# Altium integrated library Regulators.IntLib: 149 symbols (continued)
## MCP1640T-I/CHY (continued)
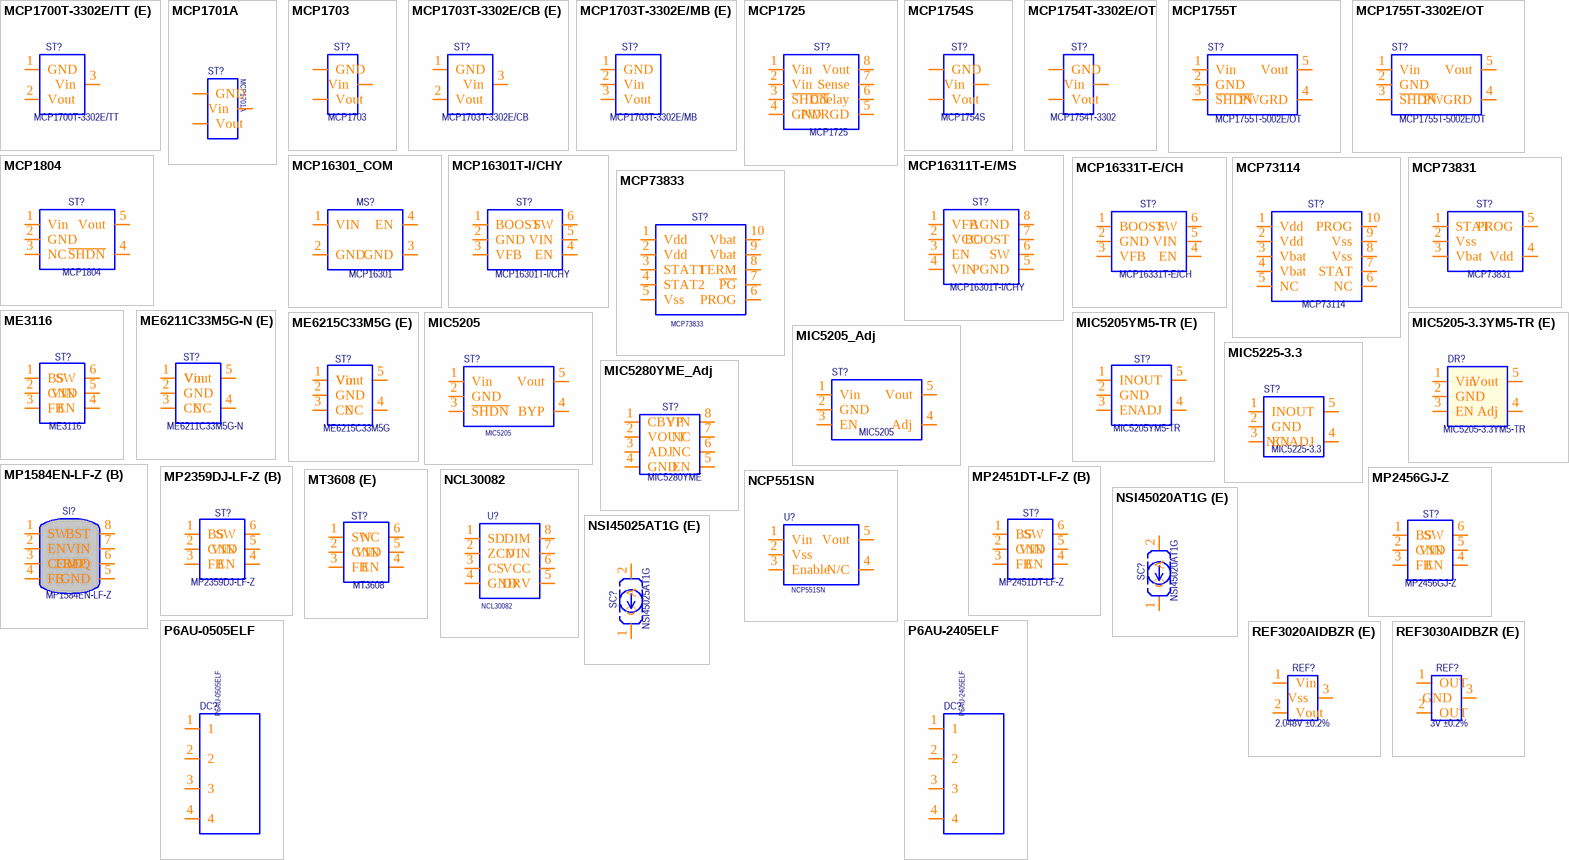
[diagram p2: symbols MCP1700T-3302E/TT (E) to REF3030AIDBZR (E)]

## MCP1700T-3302E/TT (E)
designator ST?, comment MCP1700T-3302E/TT
LOW DROPOUT REGULATORS(LDO) POSITIVE FIXED 350MV @ 250MA 6V 3.3V 250MA SOT-23(SOT-23-3) ROHS; Manufacturer: Microchip Tech; Marking: CSY9; Detailed Description: LOW DROPOUT REGULATORS(LDO) POSITIVE FIXED 680MV @ 100MA 6V 3.3V 200MA SOT-23-3L ROHS; ComponentLink1URL: http://www.microchip.com/wwwproducts/en/en554058; ComponentLink2URL: http://ww1.microchip.com/downloads/en/DeviceDoc/20005004D.pdf; Package / Case: SOT-23-3; PartNumber LCSC: C39051; Note: LOW DROPOUT REGULATORS(LDO); Operating Temperature: -40C to +85C; Voltage: 6V 3.3V 250MA; HelpURL: https://datasheet.lcsc.com/szlcsc/Microchip-Tech-MCP1700T-3302E-TT_C39051.pdf; Manufacturer PartNumber: MCP1700T-3302E/TT; Pricing LCSC: 0.2504; Publisher: Catcatcat Electronics; Website developer: http://catcatcat.d-lan.dp.ua/; Assembly type: Extended Part; Value: MCP1700T-3302E/TT
footprint SOT-23-3
pins: 1 GND, 2 Vout, 3 Vin

## MCP1701A
designator ST?  (value not drawn)
Value: *; Publisher: Catcatcat Electronics; Operating Temperature: -40C to +85C; Website developer: http://catcatcat.d-lan.dp.ua/; Assembly type: Basic Extended Part
footprint SOT-23-3N
pins: 1 GND, 2 Vout, 3 Vin

## MCP1703
designator ST?  value MCP1703  (hidden comment: *)
Publisher: Catcatcat Electronics; Operating Temperature: -40C to +85C; Website developer: http://catcatcat.d-lan.dp.ua/; Assembly type: Basic Extended Part
footprint SOT-23-3L
pins: 1 GND, 2 Vout, 3 Vin

## MCP1703T-3302E/CB (E)
designator ST?, comment MCP1703T-3302E/CB
LOW DROPOUT REGULATORS(LDO) POSITIVE FIXED 725MV @ 250MA 16V 3.3V 250MA SOT-23-3L ROHS; Manufacturer: Microchip Tech; Marking: HUES; Detailed Description: LOW DROPOUT REGULATORS(LDO) POSITIVE FIXED 680MV @ 100MA 6V 3.3V 200MA SOT-23-3L ROHS; ComponentLink1URL: http://www.microchip.com/wwwproducts/en/en554058; ComponentLink2URL: http://ww1.microchip.com/downloads/en/DeviceDoc/20005004D.pdf; Package / Case: SOT-23-3L; PartNumber LCSC: C53352; Note: LOW DROPOUT REGULATORS(LDO); Operating Temperature: -40C to +85C; Voltage: 16V 3.3V 250MA; HelpURL: https://datasheet.lcsc.com/szlcsc/Microchip-Tech-MCP1703T-3302E-CB_C53352.pdf; Manufacturer PartNumber: MCP1703T-3302E/CB; Pricing LCSC: 0.3838; Publisher: Catcatcat Electronics; Website developer: http://catcatcat.d-lan.dp.ua/; Assembly type: Extended Part; Value: MCP1703T-3302E/CB
footprint SOT-23-3L
pins: 1 GND, 2 Vout, 3 Vin

## MCP1703T-3302E/MB (E)
designator ST?, comment MCP1703T-3302E/MB
LOW DROPOUT REGULATORS(LDO) POSITIVE FIXED 725MV @ 250MA 16V 3.3V 250MA SOT-89(SOT-89-3) ROHS; Manufacturer: Microchip Tech; Marking: HU1824; Detailed Description: LOW DROPOUT REGULATORS(LDO) POSITIVE FIXED 680MV @ 100MA 6V 3.3V 200MA SOT-23-3L ROHS; ComponentLink1URL: http://www.microchip.com/wwwproducts/en/en554058; ComponentLink2URL: http://ww1.microchip.com/downloads/en/DeviceDoc/20005004D.pdf; Package / Case: SOT-89-3; PartNumber LCSC: C27287; Note: LOW DROPOUT REGULATORS(LDO); Operating Temperature: -40C to +85C; Voltage: 16V 3.3V 250MA; HelpURL: https://datasheet.lcsc.com/szlcsc/Microchip-Tech-MCP1703T-3302E-MB_C27287.pdf; Manufacturer PartNumber: MCP1703T-3302E/MB; Pricing LCSC: 0.2925; Publisher: Catcatcat Electronics; Website developer: http://catcatcat.d-lan.dp.ua/; Assembly type: Extended Part; Value: MCP1703T-3302E/MB
footprint SOT-89-3
pins: 1 GND, 2 Vin, 3 Vout

## MCP1725
designator ST?  value MCP1725  (hidden comment: *)
Publisher: Catcatcat Electronics; Operating Temperature: -40C to +85C; Website developer: http://catcatcat.d-lan.dp.ua/; Assembly type: Basic Extended Part
footprint SOIC8M
pins: 1 Vin, 2 Vin, 3 ~{SHDN}, 4 GND, 5 PWRGD, 6 Cdelay, 7 Sense, 8 Vout

## MCP1754S
designator ST?  value MCP1754S  (hidden comment: *)
150 mA, 16V, High-Performance LDO; Publisher: Catcatcat Electronics; Operating Temperature: -40C to +85C; HelpURL: https://ww1.microchip.com/downloads/en/DeviceDoc/MCP1754-MCP1754S-Data-Sheet-DS20002276D.pdf; Website developer: http://catcatcat.d-lan.dp.ua/; Assembly type: Basic Extended Part
footprint SOT-23A
pins: 1 GND, 2 Vout, 3 Vin

## MCP1754T-3302E/OT
designator ST?  value MCP1754T-3302  (hidden comment: MCP1754T-3302E/OT)
150 mA, 16V, High-Performance LDO; Package / Case: SOT-23; Publisher: Catcatcat Electronics; Operating Temperature: -40C to +85C; HelpURL: https://ww1.microchip.com/downloads/en/DeviceDoc/MCP1754-MCP1754S-Data-Sheet-DS20002276D.pdf; Website developer: http://catcatcat.d-lan.dp.ua/; Assembly type: Basic Extended Part
footprint SOT-23A
pins: 1 GND, 2 Vout, 3 Vin

## MCP1755T
designator ST?  value MCP1755T-5002E/OT  (hidden comment: *)
300 mA, 16V, High-Performance LDO; Package / Case: SOT-23-5; Publisher: Catcatcat Electronics; Operating Temperature: -40C to +85C; HelpURL: http://ww1.microchip.com/downloads/en/DeviceDoc/25160A.pdf; Website developer: http://catcatcat.d-lan.dp.ua/; Assembly type: Basic Extended Part
footprint SOT-23-5A
pins: 1 Vin, 2 GND, 3 ~{SHDN}, 4 PWGRD, 5 Vout

## MCP1755T-3302E/OT
designator ST?  value MCP1755T-5002E/OT  (hidden comment: MCP1755T-3302E/OT)
300 mA, 16V, High-Performance LDO; Package / Case: SOT-23-5; Publisher: Catcatcat Electronics; Operating Temperature: -40C to +85C; HelpURL: http://ww1.microchip.com/downloads/en/DeviceDoc/25160A.pdf; Website developer: http://catcatcat.d-lan.dp.ua/; Assembly type: Basic Extended Part
footprint SOT-23-5A
pins: 1 Vin, 2 GND, 3 ~{SHDN}, 4 PWGRD, 5 Vout

## MCP1804
designator ST?  value MCP1804  (hidden comment: *)
Publisher: Catcatcat Electronics; Operating Temperature: -40C to +85C; Website developer: http://catcatcat.d-lan.dp.ua/; Assembly type: Basic Extended Part
footprint SOT-23-5L
footprint SOT-23-5N
pins: 1 Vin, 2 GND, 3 NC, 4 ~{SHDN}, 5 Vout

## MCP16301_COM
designator MS?  value MCP16301  (hidden comment: *)
Publisher: Catcatcat Electronics; Operating Temperature: -40C to +85C; Website developer: http://catcatcat.d-lan.dp.ua/; Assembly type: Basic Extended Part
footprint MCP16301_COM
pins: 1 VIN, 2 GND, 3 GND, 4 EN

## MCP16301T-I/CHY
designator ST?  value MCP16301T-I/CHY  (hidden comment: *)
IC REG BUCK ADJ 0.6A SOT23-6; Voltage: 30 V; Marking: HT(NN)  где-NN Alphanumeric traceability code; ComponentLink1URL: http://www.microchip.com/wwwproducts/en/en554058; ComponentLink2URL: http://ww1.microchip.com/downloads/en/DeviceDoc/20005004D.pdf; Dealer Аlternative: https://detail.1688.com/offer/538948560607.html; Dealer LCSC: http://www.microchip.ua/index.php; Package / Case: SOT-23-6; PartNumber Digi-Key: 0.55; PartNumber LCSC: 0.235; Publisher: Catcatcat Electronics; Operating Temperature: -40C to +85C; HelpURL: https://www.digikey.com/product-detail/en/microchip-technology/MCP16301T-I-CHY/MCP16301T-I-CHYCT-ND/2696163; Manufacturer: https://www.microchip.com/wwwproducts/en/en554058; Manufacturer PartNumber: MCP16301T-I/CHY; Website developer: http://catcatcat.d-lan.dp.ua/; Assembly type: Basic Extended Part
footprint SOT-23-6L
pins: 1 BOOST, 2 GND, 3 VFB, 4 EN, 5 VIN, 6 SW

## MCP16311T-E/MS
designator ST?  value MCP16301T-I/CHY  (hidden comment: *)
IC REG BUCK ADJ 1A SYNC 8MSOP; Voltage: 30 V; Marking: HT(NN)  где-NN Alphanumeric traceability code; ComponentLink1URL: http://www.microchip.com/wwwproducts/en/en554058; ComponentLink2URL: http://ww1.microchip.com/downloads/en/DeviceDoc/20005004D.pdf; Dealer Аlternative: https://detail.1688.com/offer/538948560607.html; Dealer LCSC: http://www.microchip.ua/index.php; Package / Case: SOT-23-6; PartNumber Digi-Key: 0.55; PartNumber LCSC: 0.235; Publisher: Catcatcat Electronics; Operating Temperature: -40C to +85C; HelpURL: https://www.digikey.com/product-detail/en/microchip-technology/MCP16301T-I-CHY/MCP16301T-I-CHYCT-ND/2696163; Manufacturer: https://www.microchip.com/wwwproducts/en/en554058; Manufacturer PartNumber: MCP16301T-I/CHY; Website developer: http://catcatcat.d-lan.dp.ua/; Assembly type: Basic Extended Part
footprint MSOP8
footprint MSOP8n
pins: 1 VFB, 2 VCC, 3 EN, 4 VIN, 5 PGND, 6 SW, 7 BOOST, 8 AGND

## MCP16331T-E/CH
designator ST?  value MCP16331T-E/CH  (hidden comment: *)
IC REG BUCK ADJ 500MA SOT23-6; Manufacturer: Microchip Technology Inc.; Manufacturer PartNumber: MCP16301T-I/CHY; Note: Buck Switching Regulator IC Positive Adjustable 2V 1 Output 500mA SOT-23-6; Voltage: 50V; ComponentLink1URL: http://www.microchip.com/wwwproducts/en/en554058; ComponentLink2URL: http://ww1.microchip.com/downloads/en/DeviceDoc/20005004D.pdf; Dealer Аlternative: https://detail.1688.com/offer/538948560607.html; Dealer LCSC: https://lcsc.com/product-detail/Others_Microchip-Tech_MCP16331T-E-CH_Microchip-Tech-MCP16331T-E-CH_C105695.html; Package / Case: SOT-23-6; PartNumber Digi-Key: MCP16331T-E/CHCT-ND; PartNumber LCSC: C105695; Publisher: Catcatcat Electronics; Operating Temperature: -40°C ~ 125°C (TJ); HelpURL: http://www.microchip.com/mymicrochip/filehandler.aspx?ddocname=en569798; Website developer: http://catcatcat.d-lan.dp.ua/; Detailed Description: Buck Switching Regulator IC Positive Adjustable 2V 1 Output 500mA SOT-23-6; Dealer Digi-Key: https://www.digikey.com/product-detail/en/microchip-technology/MCP16331T-E-CH/MCP16331T-E-CHCT-ND/4972815; Dealer Mouser: https://eu.mouser.com/ProductDetail/Microchip-Technology/MCP16331T-E-CH?qs=%2Fha2pyFaduglOAh2Sr%2FjXh7iYp%2FBaUe%252BNuf7mE4yUvmwJIeWfk5lQg%3D%3D; PartNumber Mouser: 579-MCP16331T-E/CH; Pricing Mouser: 1.31; Pricing Digi-Key: 1.34000; Pricing LCSC: 1.3788; Assembly type: Basic Extended Part
footprint SOT-23-6L
pins: 1 BOOST, 2 GND, 3 VFB, 4 EN, 5 VIN, 6 SW

## MCP73114
designator ST?  value MCP73114  (hidden comment: *)
Publisher: Catcatcat Electronics; Operating Temperature: -40C to +85C; Website developer: http://catcatcat.d-lan.dp.ua/; Assembly type: Basic Extended Part
footprint DFN 3*3*0.9
pins: 1 Vdd, 2 Vdd, 3 Vbat, 4 Vbat, 5 NC, 6 NC, 7 STAT, 8 Vss, 9 Vss, 10 PROG

## MCP73831
designator ST?  value MCP73831  (hidden comment: *)
Publisher: Catcatcat Electronics; Operating Temperature: -40C to +85C; Website developer: http://catcatcat.d-lan.dp.ua/; Assembly type: Basic Extended Part
footprint SOT-23-5N
pins: 1 STAT, 2 Vss, 3 Vbat, 4 Vdd, 5 PROG

## MCP73833
designator ST?  (value not drawn)
Value: *; Publisher: Catcatcat Electronics; Operating Temperature: -40C to +85C; Website developer: http://catcatcat.d-lan.dp.ua/; Assembly type: Basic Extended Part
footprint DFN 3*3*0.9
pins: 1 Vdd, 2 Vdd, 3 STAT1, 4 STAT2, 5 Vss, 6 PROG, 7 ~{PG}, 8 TERM, 9 Vbat, 10 Vbat, 11 hidden

## ME3116
designator ST?  value ME3116  (hidden comment: *)
SOT-23-6, IN 4.2V 40V, OU 0.8V 40V 1.2A DC-DC Converters Step-Down Adjustable 1; Manufacturer: Nanjing Micro One Elec; Voltage: 1 4.75V 40V 1A; Marking: 1HQE; Detailed Description: DC-DC Converters Step-Down Adjustable 1 4.75V 40V 1A SOT-23-6 RoHS; ComponentLink1URL: http://www.microchip.com/wwwproducts/en/en554058; ComponentLink2URL: http://ww1.microchip.com/downloads/en/DeviceDoc/20005004D.pdf; Dealer LCSC: https://lcsc.com/product-detail/DC-DC-Converters_ME3116_C97643.html; Package / Case: SOT-23-6; PartNumber LCSC: C97643; Operating Temperature: -40C to +85C; HelpURL: https://datasheet.lcsc.com/szlcsc/Nanjing-Micro-One-Elec-ME3116_C97643.pdf; Manufacturer PartNumber: ME3116; Pricing LCSC: 0.1470; Publisher: Catcatcat Electronics; Website developer: http://catcatcat.d-lan.dp.ua/; Assembly type: Basic Extended Part
footprint SOT457 (SC-74; TSOP6)
pins: 1 BS, 2 GND, 3 FB, 4 EN, 5 VIN, 6 SW

## ME6211C33M5G-N (E)
designator ST?, comment ME6211C33M5G-N
SOT-25 Vin 6V  Vout 3.3V 500mA; Manufacturer: Nanjing Micro One Elec; Marking: S2RC; Detailed Description: LOW DROPOUT REGULATORS(LDO) POSITIVE FIXED 260MV @ 200MA (TYP) 6V 3.3V 500MA SOT-23-5 ROHS; ComponentLink1URL: http://www.microchip.com/wwwproducts/en/en554058; ComponentLink2URL: http://ww1.microchip.com/downloads/en/DeviceDoc/20005004D.pdf; Package / Case: SOT-23-5; PartNumber LCSC: C82942; Operating Temperature: -40C to +85C; Voltage: Vin 6V  Vout 3.3V 500mA; HelpURL: https://datasheet.lcsc.com/szlcsc/Nanjing-Micro-One-Elec-ME6211C33M5G-N_C82942.pdf; Manufacturer PartNumber: ME6211C33M5G-N; Pricing LCSC: 0.0535; Publisher: Catcatcat Electronics; Website developer: http://catcatcat.d-lan.dp.ua/; Assembly type: Extended Part; Value: ME6211C33M5G-N
footprint SOT753 (SOT25, TSOP5)
pins: 1 Vin, 2 GND, 3 CE, 4 NC, 5 Vout

## ME6215C33M5G (E)
designator ST?, comment ME6215C33M5G
SOT-25 Vin 18V  Vout 3.3V 350mA; Manufacturer: Nanjing Micro One Elec; Marking: S2RC; Detailed Description: LOW DROPOUT REGULATORS(LDO) POSITIVE FIXED 320MV @ 200MA (TYP) 18V 3.3V 350MA SOT-23-5 ROHS; ComponentLink1URL: http://www.microchip.com/wwwproducts/en/en554058; ComponentLink2URL: http://ww1.microchip.com/downloads/en/DeviceDoc/20005004D.pdf; Package / Case: SOT-23-5; PartNumber LCSC: C84119; Operating Temperature: -40C to +85C; Voltage: Vin 18V  Vout 3.3V 350mA; HelpURL: https://datasheet.lcsc.com/szlcsc/Nanjing-Micro-One-Elec-ME6215C33M5G_C84119.pdf; Manufacturer PartNumber: ME6215C33M5G; Pricing LCSC: 0.0699; Publisher: Catcatcat Electronics; Website developer: http://catcatcat.d-lan.dp.ua/; Assembly type: Extended Part; Value: ME6215C33M5G
footprint SOT753 (SOT25, TSOP5)
pins: 1 Vin, 2 GND, 3 CE, 4 NC, 5 Vout

## MIC5205
designator ST?  (value not drawn)
Value: *; Publisher: Catcatcat Electronics; Operating Temperature: -40C to +85C; Website developer: http://catcatcat.d-lan.dp.ua/; Assembly type: Basic Extended Part
footprint SOT-23-5N
pins: 1 Vin, 2 GND, 3 ~{SHDN}, 4 BYP, 5 Vout

## MIC5205-3.3YM5-TR (E)
designator DR?, comment MIC5205-3.3YM5-TR
Fixed 16V 3.3V 350mV @ 150mA SOT-23-5 Dropout Regulators(LDO) RoHS; Manufacturer: NATLINEAR; Marking: KB33; Detailed Description: Fixed 6V 3.3V 240mV @ 50mA SOT-23-3L Dropout Regulators(LDO) RoHS; Package / Case: SOT-23-5; PartNumber LCSC: C37970; Publisher: Catcatcat Electronics; Note: Dropout Regulators(LDO); Operating Temperature: -40C to +85C; HelpURL: https://datasheet.lcsc.com/lcsc/1809041613_Microchip-Tech-MIC5205-3-3YM5-TR_C37970.pdf; Manufacturer PartNumber: MIC5205-3.3YM5-TR; Website developer: http://catcatcat.d-lan.dp.ua/; Pricing LCSC: 0.1526; Assembly type: Extended Part; Fixed fee LCSC: 2.7735; Minimum quantity LCSC: 15; Value: MIC5205-3.3YM5-TR
footprint SOT-23-5
pins: 1 Vin, 2 GND, 3 EN, 4 Adj, 5 Vout

## MIC5205_Adj
designator ST?  value MIC5205  (hidden comment: *)
Publisher: Catcatcat Electronics; Operating Temperature: -40C to +85C; Website developer: http://catcatcat.d-lan.dp.ua/; Assembly type: Basic Extended Part
footprint SOT-23-5N
footprint SOT-23-5L
pins: 1 Vin, 2 GND, 3 EN, 4 Adj, 5 Vout

## MIC5205YM5-TR (E)
designator ST?, comment MIC5205YM5-TR
SOT-23-5, (LDO ADJUSTABLE), in 16V, ou 1.2V 15.65V 150MA; Manufacturer: Texas Instruments; Detailed Description: LOW DROPOUT REGULATORS(LDO) POSITIVE ADJUSTABLE 350MV @ 150MA 16V 1.242V 15.65V 150MA SOT-23-5 ROHS; Package / Case: C7387; PartNumber LCSC: SOT-23-5; Publisher: Catcatcat Electronics; Operating Temperature: -40C to +85C; HelpURL: https://datasheet.lcsc.com/szlcsc/Microchip-Tech-MIC5205YM5_C7387.pdf; Manufacturer PartNumber: MIC5205YM5-TR; Website developer: http://catcatcat.d-lan.dp.ua/; Pricing LCSC: 0.2928; Assembly type: Extended Part; Value: MIC5205YM5-TR
footprint SOT-25
pins: 1 IN, 2 GND, 3 EN, 4 ADJ, 5 OUT

## MIC5225-3.3
designator ST?  value MIC5225-3.3  (hidden comment: *)
IC REG LINEAR 3.3V 150MA SOT23-5; Manufacturer: Microchip Technology; Manufacturer PartNumber: MIC5225-3.3YM5-TR; Note: 16V; Detailed Description: Linear Voltage Regulator IC  1 Output  150mA SOT-23-5; Dealer LCSC: https://lcsc.com/product-detail/Low-Dropout-Regulators-LDO_MICROCHIP_MIC5225-5-0YM5-TR_MIC5225-5-0YM5-TR_C145704.html; Package / Case: SOT23, SC-74A, SOT-753; PartNumber Digi-Key: 576-2980-1-ND; PartNumber LCSC: C37970; Publisher: Catcatcat Electronics; Operating Temperature: -40C to +85C; Voltage: 3.3V; HelpURL: http://www.microchip.com/mymicrochip/filehandler.aspx?ddocname=en579718; Website developer: http://catcatcat.d-lan.dp.ua/; Dealer Digi-Key: https://www.digikey.com/product-detail/en/microchip-technology/MIC5225YM5-TR/576-2998-2-ND/1834698; Dealer Mouser: https://eu.mouser.com/ProductDetail/Microchip-Technology-Micrel/MIC5225-50YM5-TR?qs=sGAEpiMZZMsGz1a6aV8DcNranXV84HMLQYqeW61Rky4%3D; Manufacturer URL: https://www.microchip.com/wwwproducts/en/MIC5225; PartNumber Mouser: 998-MIC5225-3.3YM5TR; Pricing Mouser: 0.394; Pricing Digi-Key: 0.40000; Pricing LCSC: 0.2758; Assembly type: Basic Extended Part
footprint SOT-23-5N
footprint SOT-23-5L
pins: 1 IN, 2 GND, 3 EN, 4 NC/ADJ, 5 OUT

## MIC5280YME_Adj
designator ST?, comment MIC5280YME
SOIC-8, in 120V, ADJUSTABLE 1.5V @ 25MA 120V; Manufacturer: Microchip Tech; Detailed Description: LOW DROPOUT REGULATORS(LDO) POSITIVE ADJUSTABLE 1.5V @ 25MA 120V 1.215V 5V 25MA SOIC-8_EP_150MIL ROHS; PartNumber LCSC: C144334; Publisher: Catcatcat Electronics; Operating Temperature: -40C to +85C; HelpURL: https://datasheet.lcsc.com/szlcsc/Microchip-Tech-MIC5280YME_C144334.pdf; Manufacturer PartNumber: MIC5280YME; Website developer: http://catcatcat.d-lan.dp.ua/; Pricing LCSC: 1.7522; Assembly type: Basic Extended Part; Value: MIC5280YME
footprint SOIC8M
pins: 1 CBYP, 2 VOUT, 3 ADJ, 4 GND, 5 EN, 6 NC, 7 NC, 8 VIN

## MP1584EN-LF-Z (B)
designator SI?, comment MP1584EN-LF-Z
DC-DC CONVERTERS STEP-DOWN ADJUSTABLE 1 4.5V 28V 0.8V 25V 3A SOIC-8_EP_150MIL ROHS; Manufacturer: Monolithic Power Systems; Package / Case: SOIC-8_3.9x4.9x1.27P; PartNumber LCSC: C15051; Publisher: Catcatcat Electronics; Operating Temperature: -40C to +85C; HelpURL: https://www.monolithicpower.com/en/documentview/productdocument/index/version/2/document_type/Datasheet/lang/en/sku/MP1584/document_id/204/; Manufacturer PartNumber: MP1584EN-LF-Z; Website developer: http://catcatcat.d-lan.dp.ua/; Detailed Description: DC-DC CONVERTERS STEP-DOWN ADJUSTABLE 1 4.5V 28V 0.8V 25V 3A SOIC-8_EP_150MIL ROHS; Pricing LCSC: 0.3643; Assembly type: Basic Part; Value: MP1584EN-LF-Z
footprint SOIC8E
pins: 1 SW, 2 EN, 3 COMP, 4 FB, 5 GND, 6 FREQ, 7 VIN, 8 BST

## MP2359DJ-LF-Z (B)
designator ST?, comment MP2359DJ-LF-Z
SOT-23-6, IN 4.5V 24V, OU 0.81V 15V 1.2A DC-DC Converters Step-Down Adjustable 1; Manufacturer: Monolithic Power Systems/MPS; Voltage: 4.5V 24V 0.81V 15V 1.2A; Marking: IF8HA; Detailed Description: DC-DC CONVERTERS STEP-DOWN ADJUSTABLE 1 4.5V 24V 0.81V 15V 1.2A SOT-23-6 ROHS; ComponentLink1URL: http://www.microchip.com/wwwproducts/en/en554058; ComponentLink2URL: http://ww1.microchip.com/downloads/en/DeviceDoc/20005004D.pdf; Package / Case: SOT-23-6; PartNumber LCSC: C14259; Note: DC-DC CONVERTERS STEP-DOWN ADJ; Operating Temperature: -40C to +85C; HelpURL: https://www.mouser.com/datasheet/2/277/MP2359_r1.21-1384196.pdf; Manufacturer PartNumber: MP2359DJ-LF-Z; Pricing LCSC: 0.1958; Publisher: Catcatcat Electronics; Website developer: http://catcatcat.d-lan.dp.ua/; Assembly type: Basic Part; Value: MP2359DJ-LF-Z
footprint SOT457 (SC-74; TSOP6)
pins: 1 BS, 2 GND, 3 FB, 4 EN, 5 VIN, 6 SW

## MP2451DT-LF-Z (B)
designator ST?, comment MP2451DT-LF-Z
SOT-23-6, IN 3.3V 36V, OU 0.8V 28.8V 0.6A DC-DC Converters Step-Down Adjustable 1; Manufacturer: Monolithic Power Systems/MPS; Voltage: 3.3V 36V 0.8V 28.8V 600MA; Marking: IV7GW; Detailed Description: DC-DC CONVERTERS STEP-DOWN ADJUSTABLE 1 3.3V 36V 0.8V 28.8V 600MA SOT-23-6 ROHS; ComponentLink1URL: http://www.microchip.com/wwwproducts/en/en554058; ComponentLink2URL: http://ww1.microchip.com/downloads/en/DeviceDoc/20005004D.pdf; Package / Case: SOT-23-6; PartNumber LCSC: C14123; Note: DC-DC CONVERTERS STEP-DOWN ADJ; Operating Temperature: -40C to +85C; HelpURL: https://www.mouser.com/datasheet/2/277/MP2451_r1.33-1384199.pdf; Manufacturer PartNumber: MP2451DT-LF-Z; Pricing LCSC: 0.2557; Publisher: Catcatcat Electronics; Website developer: http://catcatcat.d-lan.dp.ua/; Assembly type: Basic Part; Value: MP2451DT-LF-Z
footprint SOT457 (SC-74; TSOP6)
pins: 1 BS, 2 GND, 3 FB, 4 EN, 5 VIN, 6 SW

## MP2456GJ-Z
designator ST?  value MP2456GJ-Z  (hidden comment: *)
SOT-23-6, IN 4.5V 50V, OU 0.81V 45V 0.5A DC-DC Converters Step-Down Adjustable 1; Manufacturer: Monolithic Power Systems/MPS; Voltage: 4.5V 50V 0.81V 45V 500mA; Marking: AGVG; Detailed Description: DC-DC Converters Step-Down Adjustable 1 4.5V 50V 0.81V 45V 500mA TSOT-23-6 RoHS; ComponentLink1URL: http://www.microchip.com/wwwproducts/en/en554058; ComponentLink2URL: http://ww1.microchip.com/downloads/en/DeviceDoc/20005004D.pdf; Dealer LCSC: https://lcsc.com/product-detail/DC-DC-Converters_MPS_MP2456GJ-Z_MP2456GJ-Z_C88045.html; Package / Case: SOT-23-6; PartNumber LCSC: C88045; Operating Temperature: -40C to +85C; HelpURL: https://datasheet.lcsc.com/szlcsc/Monolithic-Power-Systems-MPS-MP2456GJ-Z_C88045.pdf; Manufacturer PartNumber: MP2456GJ-Z; Pricing LCSC: 0.3121; Publisher: Catcatcat Electronics; Website developer: http://catcatcat.d-lan.dp.ua/; Assembly type: Basic Extended Part
footprint SOT457 (SC-74; TSOP6)
pins: 1 BS, 2 GND, 3 FB, 4 EN, 5 VIN, 6 SW

## MT3608 (E)
designator ST?  value MT3608  (hidden comment: *)
DC-DC Converters Step-Up Adjustable 1 2V 24V 28V SOT-23-6 RoHS; Manufacturer: XI'AN Aerosemi Tech; PartNumber Аlternative: 027628; Voltage: 4-24 V; Pricing Аlternative: 0.0880; ComponentLink1URL: http://www.microchip.com/wwwproducts/en/en554058; ComponentLink2URL: http://ww1.microchip.com/downloads/en/DeviceDoc/20005004D.pdf; Dealer Аlternative: https://voron.ua/catalog/027628--mikroshema_mt3608_aerosemi_aerosemi_technology_sot23-6_sot236_b628; Dealer LCSC: https://lcsc.com/product-detail/DC-DC-Converters_MT3608_C84817.html; Package / Case: SOT-23-6; PartNumber LCSC: C84817; Note: DC-DC CONVERTERS STEP-UP ADJ; Operating Temperature: -40C to +85C; HelpURL: https://datasheet.lcsc.com/szlcsc/XI-AN-Aerosemi-Tech-MT3608_C84817.pdf; Manufacturer PartNumber: MT3608; Detailed Description: DC-DC Converters Step-Up Adjustable 1 2V 24V 28V SOT-23-6 RoHS; Pricing LCSC: 0.0795; Publisher: Catcatcat Electronics; Website developer: http://catcatcat.d-lan.dp.ua/; Assembly type: Extended Part
footprint SOT457 (SC-74; TSOP6)
pins: 1 SW, 2 GND, 3 FB, 4 EN, 5 VIN, 6 NC

## NCL30082
designator U?  (value not drawn)
Value: *; Publisher: Catcatcat Electronics; Operating Temperature: -40C to +85C; Website developer: http://catcatcat.d-lan.dp.ua/; Assembly type: Basic Extended Part
footprint Micro8
pins: 1 SD, 2 ZCD, 3 CS, 4 GND, 5 DRV, 6 VCC, 7 VIN, 8 DIM

## NCP551SN
designator U?  (value not drawn)
Value: *; Publisher: Catcatcat Electronics; Operating Temperature: -40C to +85C; Website developer: http://catcatcat.d-lan.dp.ua/; Assembly type: Basic Extended Part
footprint SOT-23-6L
pins: 1 Vin, 2 Vss, 3 Enable, 4 N/C, 5 Vout, 6 hidden

## NSI45020AT1G (E)
designator SC?, comment NSI45020AT1G
20mA 45V LED DRIVERS SOD-123; Manufacturer: ON Semicon; Voltage: 45V 20mA; Marking: AD2; PartNumber LCSC: C128367; Publisher: Catcatcat Electronics; Operating Temperature: -40C to +85C; HelpURL: https://datasheet.lcsc.com/szlcsc/ON-Semicon-ON-NSI45020AT1G_C128367.pdf; Manufacturer PartNumber: NSI45020AT1G; Website developer: http://catcatcat.d-lan.dp.ua/; Detailed Description: 20mA 45V LED DRIVERS SOD-123; Pricing LCSC: 0.1129; Assembly type: Extended Part; Value: NSI45020AT1G
footprint SOD-123
pins: 1 C, 2 A

## NSI45025AT1G (E)
designator SC?, comment NSI45025AT1G
25mA 45V LED DRIVERS SOD-123; Manufacturer: ON Semicon; Voltage: 45V 25mA; PartNumber LCSC: C146752; Publisher: Catcatcat Electronics; Operating Temperature: -40C to +85C; HelpURL: https://datasheet.lcsc.com/szlcsc/ON-Semicon-ON-NSI45025AT1G_C146752.pdf; Manufacturer PartNumber: NSI45025AT1G; Website developer: http://catcatcat.d-lan.dp.ua/; Detailed Description: 25mA 45V LED DRIVERS SOD-123; Pricing LCSC: 0.1295; Assembly type: Extended Part; Value: NSI45025AT1G
footprint SOD-123
pins: 1 C, 2 A

## P6AU-0505ELF
designator DC?  (value not drawn)
Value: *; Publisher: Catcatcat Electronics; Operating Temperature: -40C to +85C; Website developer: http://catcatcat.d-lan.dp.ua/; Assembly type: Basic Extended Part
footprint P6AU
pins: 1, 2, 3, 4

## P6AU-2405ELF
designator DC?  (value not drawn)
Value: *; Publisher: Catcatcat Electronics; Operating Temperature: -40C to +85C; Website developer: http://catcatcat.d-lan.dp.ua/; Assembly type: Basic Extended Part
footprint P6AU
pins: 1, 2, 3, 4

## REF3020AIDBZR (E)
designator REF?, comment value 2.048V ±0.2%  (hidden comment: REF3020AIDBZR)
VOLTAGE REFERENCES 2.048V ±0.2% 75PPM/°C SOT-23(SOT-23-3) ROHS; Manufacturer: Texas Instruments; Marking: R308; Package / Case: SOT-23; PartNumber LCSC: C26804; Publisher: Catcatcat Electronics; Operating Temperature: -40C to +85C; Tolerance: ±0.2% 75PPM/°C; Voltage: 2.048V; HelpURL: https://datasheet.lcsc.com/szlcsc/Texas-Instruments-TI-REF3020AIDBZR_C26804.pdf; Manufacturer PartNumber: REF3020AIDBZR; Website developer: http://catcatcat.d-lan.dp.ua/; Detailed Description: VOLTAGE REFERENCES 2.048V ±0.2% 75PPM/°C SOT-23(SOT-23-3) ROHS; Pricing LCSC: 0.6078; Assembly type: Extended Part
footprint SOT-23-3M
pins: 1 Vin, 2 Vout, 3 Vss

## REF3030AIDBZR (E)
designator REF?, comment value 3V ±0.2%  (hidden comment: REF3030AIDBZR)
VOLTAGE REFERENCES 3V ±0.2% 75PPM/°C SOT-23(SOT-23-3) ROHS; Manufacturer: Texas Instruments; Marking: R30F; Package / Case: SOT-23; PartNumber LCSC: C38423; Publisher: Catcatcat Electronics; Operating Temperature: -40C to +85C; Tolerance: ±0.2%; Voltage: 3V; HelpURL: https://datasheet.lcsc.com/szlcsc/Texas-Instruments-TI-REF3030AIDBZR_C38423.pdf; Manufacturer PartNumber: REF3030AIDBZR; Website developer: http://catcatcat.d-lan.dp.ua/; Detailed Description: VOLTAGE REFERENCES 3V ±0.2% 75PPM/°C SOT-23(SOT-23-3) ROHS; Pricing LCSC: 0.5943; Assembly type: Extended Part
footprint SOT-23-3M
pins: 1 OUT, 2 OUT, 3 GND

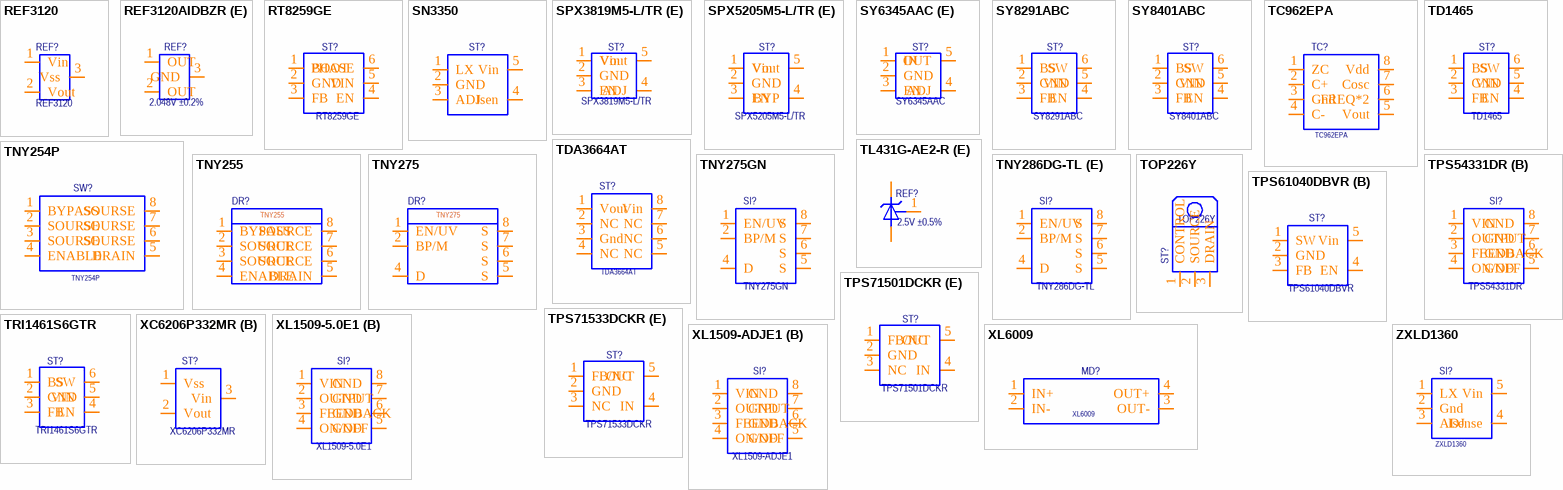
[diagram p3: symbols REF3120 to ZXLD1360]

## REF3120
designator REF?  value REF3120  (hidden comment: *)
Publisher: Catcatcat Electronics; Operating Temperature: -40C to +85C; Website developer: http://catcatcat.d-lan.dp.ua/; Assembly type: Basic Extended Part
footprint SOT-23-3N
pins: 1 Vin, 2 Vout, 3 Vss

## REF3120AIDBZR (E)
designator REF?, comment value 2.048V ±0.2%  (hidden comment: REF3120AIDBZR)
VOLTAGE REFERENCES 2.048V ±0.2% 20PPM/°C SOT-23(SOT-23-3) ROHS; Manufacturer: Texas Instruments; Marking: R30F; Package / Case: SOT-23; PartNumber LCSC: C50320; Publisher: Catcatcat Electronics; Operating Temperature: -40C to +85C; Tolerance: ±0.2% 20PPM/°C; Voltage: 2.048V; HelpURL: https://datasheet.lcsc.com/szlcsc/Texas-Instruments-TI-REF3120AIDBZR_C50320.pdf; Manufacturer PartNumber: REF3120AIDBZR; Website developer: http://catcatcat.d-lan.dp.ua/; Detailed Description: VOLTAGE REFERENCES 2.048V ±0.2% 20PPM/°C SOT-23(SOT-23-3) ROHS; Pricing LCSC: 0.9131; Assembly type: Extended Part
footprint SOT-23-3M
pins: 1 OUT, 2 OUT, 3 GND

## RT8259GE
designator ST?  value RT8259GE  (hidden comment: *)
SOT-23-6, IN 4.5V-24V, OU 0.8V-15V 1.2A DC-DC Converters Step-Down Adjustable 1; Manufacturer: Richtek Tech; Voltage: 4.5V 24V 0.8V 15V 1.2A; Marking: DK=C22; Detailed Description: DC-DC Converters Step-Down Adjustable 1 4.5V 24V 0.8V 15V 1.2A SOT-23-6 RoHS; Pricing Аlternative: 0.2894; ComponentLink1URL: http://www.microchip.com/wwwproducts/en/en554058; ComponentLink2URL: http://ww1.microchip.com/downloads/en/DeviceDoc/20005004D.pdf; Dealer LCSC: https://lcsc.com/product-detail/DC-DC-Converters_RT8259GE_C16819.html; Package / Case: SOT-23-6; PartNumber LCSC: C16819; Operating Temperature: -40C to +85C; HelpURL: https://datasheet.lcsc.com/szlcsc/Richtek-Tech-RT8259GE_C16819.pdf; Manufacturer PartNumber: RT8259GE; Publisher: Catcatcat Electronics; Website developer: http://catcatcat.d-lan.dp.ua/; Assembly type: Basic Extended Part
footprint SOT457 (SC-74; TSOP6)
pins: 1 BOOT, 2 GND, 3 FB, 4 EN, 5 VIN, 6 PHASE

## SN3350
designator ST?  (value not drawn)
Value: *; Publisher: Catcatcat Electronics; Operating Temperature: -40C to +85C; Website developer: http://catcatcat.d-lan.dp.ua/; Assembly type: Basic Extended Part
footprint SN3350
pins: 1 LX, 2 GND, 3 ADJ, 4 Isen, 5 Vin, 6 hidden

## SPX3819M5-L/TR (E)
designator ST?, comment SPX3819M5-L/TR
SOT-23-5, (LDO ADJUSTABLE), in 16V, ou 1.2V 15.3V 500MA; Manufacturer: Exar; Detailed Description: LOW DROPOUT REGULATORS(LDO) POSITIVE ADJUSTABLE 700MV @ 500MA 16V 1.235V 15.3V 500MA SOT-23-5 ROHS; Supply Input Voltage: 2.5V to 16V; Package / Case: SOT-23-5; PartNumber LCSC: C9056; Publisher: Catcatcat Electronics; Operating Temperature: -40C to +85C; HelpURL: https://datasheet.lcsc.com/szlcsc/Exar-SPX3819M5-L-TR_C9056.pdf; Manufacturer PartNumber: SPX3819M5-L/TR; Website developer: http://catcatcat.d-lan.dp.ua/; Pricing LCSC: 0.2385; Assembly type: Extended Part; Value: SPX3819M5-L/TR
footprint SOT-25
pins: 1 Vin, 2 GND, 3 EN, 4 ADJ, 5 Vout

## SPX5205M5-L/TR (E)
designator ST?, comment SPX5205M5-L/TR
SOT-23-5, IN 2.5V 16V, OU 1.21V 15.6V 1.2A DC-DC Adjustable; Manufacturer: ManufacturerExar; Voltage: 150MA 16V 1.235V 15.65V 150MA; Marking: H145; Detailed Description: LOW DROPOUT REGULATORS(LDO) POSITIVE ADJUSTABLE 350MV @ 150MA 16V 1.235V 15.65V 150MA SOT-23-5 ROHS; ComponentLink1URL: http://www.microchip.com/wwwproducts/en/en554058; ComponentLink2URL: http://ww1.microchip.com/downloads/en/DeviceDoc/20005004D.pdf; Package / Case: SOT-23-5; PartNumber LCSC: C6863; Operating Temperature: -40C to +85C; HelpURL: https://datasheet.lcsc.com/szlcsc/Exar-SPX5205M5-L-TR_C6863.pdf; Manufacturer PartNumber: SPX5205M5-L/TR; Pricing LCSC: 0.1796; Publisher: Catcatcat Electronics; Website developer: http://catcatcat.d-lan.dp.ua/; Assembly type: Extended Part; Value: SPX5205M5-L/TR
footprint SOT-25
pins: 1 Vin, 2 GND, 3 EN, 4 BYP, 5 Vout

## SY6345AAC (E)
designator ST?, comment SY6345AAC
SOT-23-5, (LDO ADJUSTABLE), in 40V, ou 0.6V 300MA; Manufacturer: Silergy Corp; Detailed Description: LOW DROPOUT REGULATORS(LDO) POSITIVE ADJUSTABLE 300MV @ 300MA 40V 0.6V 300MA SOT-23-5 ROHS; Supply Input Voltage: 4V to 40V; Package / Case: SOT-23-5; PartNumber LCSC: C98119; Publisher: Catcatcat Electronics; Operating Temperature: -40C to +85C; HelpURL: https://datasheet.lcsc.com/szlcsc/Silergy-Corp-SY6345AAC_C98119.pdf; Manufacturer PartNumber: SY6345AAC; Website developer: http://catcatcat.d-lan.dp.ua/; Pricing LCSC: 0.2406; Assembly type: Extended Part; Value: SY6345AAC
footprint SOT-25
pins: 1 IN, 2 GND, 3 EN, 4 ADJ, 5 OUT

## SY8291ABC
designator ST?  value SY8291ABC  (hidden comment: *)
SOT-23-6, IN 5V 40V, OU 0.6V 40V 1.2A DC-DC Converters Step-Down Adjustable; Manufacturer: Silergy Corp; Voltage: 1 4.75V 40V 1A; Marking: 1HQE; Detailed Description: DC-DC Converters Step-Down Adjustable 1 5V 40V 0.6V 40V 1.2A SOT-23-6 RoHS; Supply Input Voltage: 5V to 40V; ComponentLink1URL: http://www.microchip.com/wwwproducts/en/en554058; ComponentLink2URL: http://ww1.microchip.com/downloads/en/DeviceDoc/20005004D.pdf; Dealer LCSC: https://lcsc.com/product-detail/DC-DC-Converters_Silergy_SY8291ABC_SY8291ABC_C125896.html; Package / Case: SOT-23-6; PartNumber LCSC: C125896; Operating Temperature: -40C to +85C; HelpURL: https://datasheet.lcsc.com/szlcsc/Silergy-Corp-SY8291ABC_C125896.pdf; Manufacturer PartNumber: SY8291ABC; Pricing LCSC: 0.2970; Publisher: Catcatcat Electronics; Website developer: http://catcatcat.d-lan.dp.ua/; Assembly type: Basic Extended Part
footprint SOT457 (SC-74; TSOP6)
pins: 1 BS, 2 GND, 3 FB, 4 EN, 5 VIN, 6 SW

## SY8401ABC
designator ST?  value SY8401ABC  (hidden comment: *)
SOT-23-6, IN 5V 50V, OU 0.6V 50V 0.8A DC-DC Converters Step-Down Adjustable 1; Manufacturer: Silergy Corp; Voltage: 4.5V 50V 0.6V 50V 800mA; Marking: My7GA; Detailed Description: DC-DC Converters Step-Down Adjustable 1 4.5V 50V 0.6V 50V 800mA SOT-23-6 RoHS; ComponentLink1URL: http://www.microchip.com/wwwproducts/en/en554058; ComponentLink2URL: http://ww1.microchip.com/downloads/en/DeviceDoc/20005004D.pdf; Dealer LCSC: https://lcsc.com/product-detail/DC-DC-Converters_Silergy_SY8401ABC_SY8401ABC_C125906.html; Package / Case: SOT-23-6; PartNumber LCSC: C125906; Operating Temperature: -40C to +85C; HelpURL: https://datasheet.lcsc.com/szlcsc/Silergy-Corp-SY8401ABC_C125906.pdf; Manufacturer PartNumber: SY8401ABC; Pricing LCSC: 0.4439; Publisher: Catcatcat Electronics; Website developer: http://catcatcat.d-lan.dp.ua/; Assembly type: Basic Extended Part
footprint SOT457 (SC-74; TSOP6)
pins: 1 BS, 2 GND, 3 FB, 4 EN, 5 VIN, 6 SW

## TC962EPA
designator TC?  (value not drawn)
Value: *; Publisher: Catcatcat Electronics; Operating Temperature: -40C to +85C; Website developer: http://catcatcat.d-lan.dp.ua/; Assembly type: Basic Extended Part
footprint DIP8
pins: 1 ZC, 2 C+, 3 Gnd, 4 C-, 5 Vout, 6 FREQ*2, 7 Cosc, 8 Vdd

## TD1465
designator ST?  value TD1465  (hidden comment: *)
SOT-23-6, IN 4.5V-40V, OU 0.8V-30V 600mA DC-DC Converters Step-Down Adjustable 1; Manufacturer: Techcode Semicon; Voltage: 4.5V 30V 0.8V 15V 1.2A; Marking: W543; ComponentLink1URL: http://www.microchip.com/wwwproducts/en/en554058; ComponentLink2URL: http://ww1.microchip.com/downloads/en/DeviceDoc/20005004D.pdf; Dealer LCSC: https://lcsc.com/product-detail/DC-DC-Converters_Techcode-Semicon-TD1465_C193229.html; Package / Case: SOT-23-6; PartNumber LCSC: C193229; Operating Temperature: -40C to +85C; HelpURL: https://datasheet.lcsc.com/szlcsc/1811291034_Techcode-Semicon-TD1465_C193229.pdf; Manufacturer PartNumber: TD1465; Pricing LCSC: 0.1985; Publisher: Catcatcat Electronics; Website developer: http://catcatcat.d-lan.dp.ua/; Assembly type: Basic Extended Part
footprint SOT457 (SC-74; TSOP6)
pins: 1 BS, 2 GND, 3 FB, 4 EN, 5 VIN, 6 SW

## TDA3664AT
designator ST?  (value not drawn)
Value: *; Publisher: Catcatcat Electronics; Operating Temperature: -40C to +85C; Website developer: http://catcatcat.d-lan.dp.ua/; Assembly type: Basic Extended Part
footprint SO8
pins: 1 Vout, 2 NC, 3 Gnd, 4 NC, 5 NC, 6 NC, 7 NC, 8 Vin

## TL431G-AE2-R (E)
designator REF?, comment Voltage: 2.5V ±0.5%  (hidden comment: TL431G-AE2-R)
VOLTAGE REFERENCES 2.5V 36V SOT-23(SOT-23-3) ROHS; Manufacturer: Unisonic Tech; Tolerance: ±0.5%; Marking: 431; Package / Case: SOT-23; PartNumber LCSC: C71129; Publisher: Catcatcat Electronics; Operating Temperature: -40C to +85C; HelpURL: https://datasheet.lcsc.com/szlcsc/Unisonic-Tech-TL431G-AE2-R_C71129.pdf; Manufacturer PartNumber: TL431G-AE2-R; Website developer: http://catcatcat.d-lan.dp.ua/; Detailed Description: VOLTAGE REFERENCES 2.5V 36V SOT-23(SOT-23-3) ROHS; Pricing LCSC: 0.0398; Assembly type: Extended Part
footprint SOT-23-3M
pins: 1 REF, 2 CATHODE, 3 ANODE

## TNY254P
designator SW?  (value not drawn)
Value: *; Publisher: Catcatcat Electronics; Operating Temperature: -40C to +85C; Website developer: http://catcatcat.d-lan.dp.ua/; Assembly type: Basic Extended Part
footprint DIP8
pins: 1 BYPASS, 2 SOURSE, 3 SOURSE, 4 ENABLE, 5 DRAIN, 6 SOURSE, 7 SOURSE, 8 SOURSE

## TNY255
designator DR?  (value not drawn)
Value: *; Publisher: Catcatcat Electronics; Operating Temperature: -40C to +85C; Website developer: http://catcatcat.d-lan.dp.ua/; Assembly type: Basic Extended Part
footprint SMD-8
pins: 1 BYPASS, 2 SOURCE, 3 SOURCE, 4 ENABLE, 5 DRAIN, 6 SOURCE, 7 SOURCE, 8 SOURCE

## TNY275
designator DR?  (value not drawn)
Value: *; Publisher: Catcatcat Electronics; Operating Temperature: -40C to +85C; Website developer: http://catcatcat.d-lan.dp.ua/; Assembly type: Basic Extended Part
footprint SMD-8
pins: 1 EN/UV, 2 BP/M, 4 D, 5 S, 6 S, 7 S, 8 S

## TNY275GN
designator SI?
Energy-Effi cient, Off-Line Switcher With Enhanced Flexibility and Extended Power Range; Publisher: Catcatcat Electronics; Operating Temperature: -40C to +85C; Website developer: http://catcatcat.d-lan.dp.ua/; Detailed Description: Energy-Effi cient, Off-Line Switcher With Enhanced Flexibility and Extended Power Range; Assembly type: Basic Extended Part; Value: TNY275GN
footprint SMD-8C
pins: 1 EN/UV, 2 BP/M, 4 D, 5 S, 6 S, 7 S, 8 S

## TNY286DG-TL (E)
designator SI?, comment TNY286DG-TL
SWITCHING CONTROLLERS SOP-8 ROHS; Manufacturer: POWER INTEGRATIONS; PartNumber LCSC: C74528; Publisher: Catcatcat Electronics; Operating Temperature: -40C to +85C; Marking: TNY286DG; HelpURL: https://datasheet.lcsc.com/szlcsc/POWER-INTEGRATIONS-TNY286DG-TL_C74528.pdf; Manufacturer PartNumber: TNY286DG-TL; Website developer: http://catcatcat.d-lan.dp.ua/; Detailed Description: SWITCHING CONTROLLERS SOP-8 ROHS; Pricing LCSC: 0.8015; Assembly type: Extended Part; Value: TNY286DG-TL
footprint SO-8C (SO-8C_1p27_4p9x3p9)
footprint SO-8C-L (SO-8C_1p27_4p9x3p9-L)
footprint SO-8C-M (SO-8C_1p27_4p9x3p9-M)
footprint SMD-8C
pins: 1 EN/UV, 2 BP/M, 4 D, 5 S, 6 S, 7 S, 8 S

## TOP226Y
designator ST?  value TOP226Y  (hidden comment: *)
Publisher: Catcatcat Electronics; Operating Temperature: -40C to +85C; Website developer: http://catcatcat.d-lan.dp.ua/; Assembly type: Basic Extended Part
footprint TO220
pins: 1 CONTROL, 2 SOURCE, 3 DRAIN 

## TPS54331DR (B)
designator SI?, comment TPS54331DR
DC-DC CONVERTERS STEP-DOWN FIXED 1 4.5V 40V 5V 2A SOP-8_150MIL ROHS; Manufacturer: Texas Instruments; Detailed Description: DC-DC CONVERTERS STEP-DOWN ADJUSTABLE 1 3.5V 28V 0.8V 25V 3A SOIC-8_150MIL ROHS; Package / Case: SOP-8_3.9x4.9x1.27P; PartNumber LCSC: C9865; Publisher: Catcatcat Electronics; Operating Temperature: -40C to +85C; HelpURL: https://datasheet.lcsc.com/szlcsc/Texas-Instruments-TI-TPS54331DR_C9865.pdf; Manufacturer PartNumber: TPS54331DR; Website developer: http://catcatcat.d-lan.dp.ua/; Pricing LCSC: 0.2511; Assembly type: Basic Part; Value: TPS54331DR
footprint SO8
pins: 1 VIN, 2 OUTPUT, 3 FEEDBACK, 4 ON/OFF, 5 GND, 6 GND, 7 GND, 8 GND

## TPS61040DBVR (B)
designator ST?, comment TPS61040DBVR
DC-DC CONVERTERS STEP-UP ADJUSTABLE 1 1.8V 6V 28V 350MA (SWITCH) SOT-23-5 ROHS; Manufacturer: Texas Instruments; PartNumber LCSC: C7722; Publisher: Catcatcat Electronics; Note: DC-DC CONVERTERS STEP-UP ADJ; Operating Temperature: -40C to +85C; HelpURL: https://datasheet.lcsc.com/szlcsc/Texas-Instruments-TI-TPS61040DBVR_C7722.pdf; Manufacturer PartNumber: TPS61040DBVR; Website developer: http://catcatcat.d-lan.dp.ua/; Detailed Description: DC-DC CONVERTERS STEP-UP ADJUSTABLE 1 1.8V 6V 28V 350MA (SWITCH) SOT-23-5 ROHS; Pricing LCSC: 0.4288; Assembly type: Basic Part; Value: TPS61040DBVR
footprint SOT-23-5N
pins: 1 SW, 2 GND, 3 FB, 4 EN, 5 Vin

## TPS71501DCKR (E)
designator ST?, comment TPS71501DCKR
SC-70-5, (LDO ADJUSTABLE), in 24V, ou 1.2V 15V 50MA; Manufacturer: Texas Instruments; Detailed Description: LOW DROPOUT REGULATORS(LDO) POSITIVE ADJUSTABLE 750MV @ 50MA 24V 1.2V 15V 50MA SC-70-5 ROHS; Package / Case: SC-70-5; PartNumber LCSC: C149505; Publisher: Catcatcat Electronics; Operating Temperature: -40C to +85C; HelpURL: https://datasheet.lcsc.com/szlcsc/Texas-Instruments-TI-TPS71501DCKR_C149505.pdf; Manufacturer PartNumber: TPS71501DCKR; Website developer: http://catcatcat.d-lan.dp.ua/; Pricing LCSC: 0.4276; Assembly type: Extended Part; Value: TPS71501DCKR
footprint SC-70-5
pins: 1 FB/NC, 2 GND, 3 NC, 4 IN, 5 OUT

## TPS71533DCKR (E)
designator ST?, comment TPS71533DCKR
SC-70-5, (LDO), in 24V, ou 3.3V; Manufacturer: Texas Instruments; Detailed Description: LOW DROPOUT REGULATORS(LDO) POSITIVE FIXED 750MV @ 50MA 24V 3.3V 50MA SC-70-5 ROHS; Package / Case: SC-70-5; PartNumber LCSC: C32670; Publisher: Catcatcat Electronics; Operating Temperature: -40C to +85C; HelpURL: https://datasheet.lcsc.com/szlcsc/Texas-Instruments-TI-TPS71533DCKR_C32670.pdf; Manufacturer PartNumber: TPS71533DCKR; Website developer: http://catcatcat.d-lan.dp.ua/; Pricing LCSC: 0.4276; Assembly type: Extended Part; Value: TPS71533DCKR
footprint SC-70-5
pins: 1 FB/NC, 2 GND, 3 NC, 4 IN, 5 OUT

## TRI1461S6GTR
designator ST?  value TRI1461S6GTR  (hidden comment: *)
SOT23-6, 23V, 2A, 600KHz Asynchronous Synchronous / Step-Down DC/DC Converter; Manufacturer: fitipower integrated technology; PartNumber Аlternative: 035527; Voltage: 4-24 V; Pricing Аlternative: 0.2050; ComponentLink1URL: http://www.microchip.com/wwwproducts/en/en554058; ComponentLink2URL: http://ww1.microchip.com/downloads/en/DeviceDoc/20005004D.pdf; Dealer Аlternative: https://voron.ua/catalog/035527; Package / Case: SOT-23-6; Operating Temperature: -40C to +85C; HelpURL: https://voron.ua/files/pdf/micoshema/TRI1461.pdf; Manufacturer PartNumber: TRI1461S6GTR; Publisher: Catcatcat Electronics; Website developer: http://catcatcat.d-lan.dp.ua/; Assembly type: Basic Extended Part
footprint SOT457 (SC-74; TSOP6)
pins: 1 BS, 2 GND, 3 FB, 4 EN, 5 VIN, 6 SW

## XC6206P332MR (B)
designator ST?, comment XC6206P332MR
LOW DROPOUT REGULATORS(LDO) POSITIVE FIXED 680MV @ 100MA 6V 3.3V 200MA SOT-23-3L ROHS; Manufacturer: Torex Semicon; Voltage: Vin 7.0 Vout 3.3V; Marking: 662V; ComponentLink1URL: http://www.microchip.com/wwwproducts/en/en554058; ComponentLink2URL: http://ww1.microchip.com/downloads/en/DeviceDoc/20005004D.pdf; Package / Case: SOT-23-3L; PartNumber LCSC: C5446; Note: LOW DROPOUT REGULATORS(LDO); Operating Temperature: -40C to +85C; HelpURL: https://datasheet.lcsc.com/szlcsc/Torex-Semicon-XC6206P332MR_C5446.pdf; Manufacturer PartNumber: XC6206P332MR; Detailed Description: LOW DROPOUT REGULATORS(LDO) POSITIVE FIXED 680MV @ 100MA 6V 3.3V 200MA SOT-23-3L ROHS; Pricing LCSC: 0.1247; Publisher: Catcatcat Electronics; Website developer: http://catcatcat.d-lan.dp.ua/; Assembly type: Basic Part; Value: XC6206P332MR
footprint SOT-23-3L
pins: 1 Vss, 2 Vout, 3 Vin

## XL1509-5.0E1 (B)
designator SI?, comment XL1509-5.0E1
DC-DC CONVERTERS STEP-DOWN FIXED 1 4.5V 40V 5V 2A SOP-8_150MIL ROHS; Manufacturer: XLSEMI; Package / Case: SOP-8_3.9x4.9x1.27P; PartNumber LCSC: C61063; Publisher: Catcatcat Electronics; Operating Temperature: -40C to +85C; HelpURL: https://datasheet.lcsc.com/szlcsc/XLSEMI-XL1509-5-0E1_C61063.pdf; Manufacturer PartNumber: XL1509-5.0E1; Website developer: http://catcatcat.d-lan.dp.ua/; Detailed Description: DC-DC CONVERTERS STEP-DOWN FIXED 1 4.5V 40V 5V 2A SOP-8_150MIL ROHS; Pricing LCSC: 0.2047; Assembly type: Basic Part; Value: XL1509-5.0E1
footprint SO8
pins: 1 VIN, 2 OUTPUT, 3 FEEDBACK, 4 ON/OFF, 5 GND, 6 GND, 7 GND, 8 GND

## XL1509-ADJE1 (B)
designator SI?, comment XL1509-ADJE1
DC-DC CONVERTERS STEP-DOWN ADJUSTABLE 1 4.5V 40V 1.23V 37V 2A SOP-8_150MIL ROHS; Manufacturer: XLSEMI; Package / Case: SOP-8_3.9x4.9x1.27P; PartNumber LCSC: C74192; Publisher: Catcatcat Electronics; Operating Temperature: -40C to +85C; HelpURL: https://datasheet.lcsc.com/szlcsc/XLSEMI-XL1509-ADJE1_C74192.pdf; Manufacturer PartNumber: XL1509-ADJE1; Website developer: http://catcatcat.d-lan.dp.ua/; Detailed Description: DC-DC CONVERTERS STEP-DOWN ADJUSTABLE 1 4.5V 40V 1.23V 37V 2A SOP-8_150MIL ROHS; Pricing LCSC: 0.2047; Assembly type: Basic Part; Value: XL1509-ADJE1
footprint SO8
pins: 1 VIN, 2 OUTPUT, 3 FEEDBACK, 4 ON/OFF, 5 GND, 6 GND, 7 GND, 8 GND

## XL6009
designator MD?  (value not drawn)
Value: *; Publisher: Catcatcat Electronics; Operating Temperature: -40C to +85C; Website developer: http://catcatcat.d-lan.dp.ua/; Assembly type: Basic Extended Part
footprint XL6009
pins: 1 IN+, 2 IN-, 3 OUT-, 4 OUT+

## ZXLD1360
designator SI?  (value not drawn)
Value: *; Publisher: Catcatcat Electronics; Operating Temperature: -40C to +85C; Website developer: http://catcatcat.d-lan.dp.ua/; Assembly type: Basic Extended Part
footprint SOT-23-5N
pins: 1 LX, 2 Gnd, 3 ADJ, 4 Isense, 5 Vin